# Altium footprint library Sigma_Library.PcbLib: 125 footprints (part 2 of 8)
Each footprint in its own frame and in the unit in brackets; x right, y up, seen from the top. Pads: shape width x height; smd on the part's side, far side on the other; paste and mask are expansions set on the pad; w line width, h text height; cw(c..) or ccw(c..) is an arc to the next point about the centre after c.
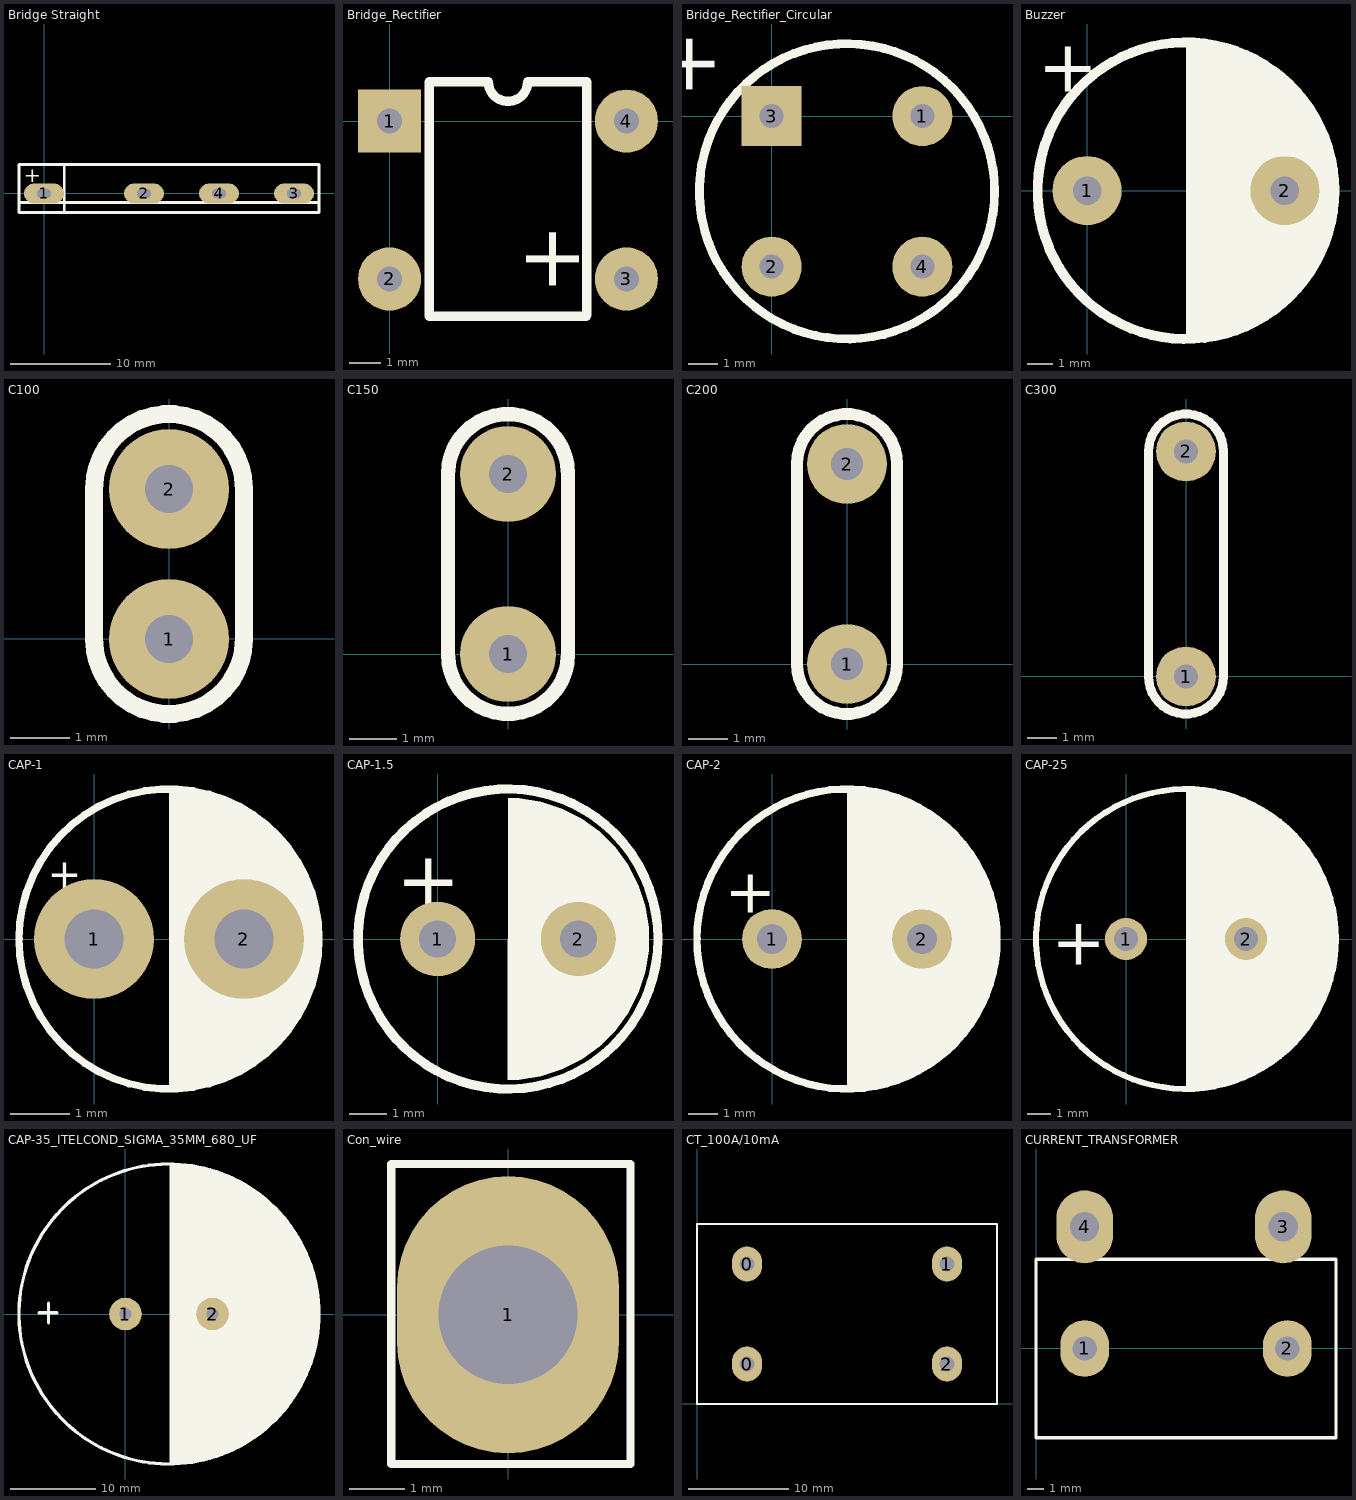
[diagram p1: the footprints below, top view; thin cyan lines are the x and y axes]

## Bridge Straight [mm] "KBJ 2510 / 25A GLASS PASSIVATED BRIDGE RECTIFIER"
height 9.91
pads (4):
  oval 4x2 hole 0.9 slot 1.4 at 0 deg: 1(0,0) 2(10,0) 3(25,0) 4(17.5,0)
Top Overlay:
  lines w0.254: -2.5,-0.9 27.5,-0.9 ; 2.032,-1.9 2.032,2.9 ; -2.5,-1.9 -2.5,2.9 27.5,2.9 27.5,-1.9 -2.5,-1.9
  text "+" at -2.007,1.143 h1.52
3D body "GBJ.STP": height 20, standoff -17.5, extent -2.402,-2.084 27.598,2.616

## Bridge_Rectifier [mil]
pads (4):
  rect 80x80 hole 32: 1(0,0)
  round 80 hole 32: 2(0,-200) 3(300,-200) 4(300,0)
Top Overlay:
  lines w12: 50,-247 100,-247 200,-247 249,-247 250,-246 250,50 175,50 cw(c150,50) 125,50 50,50 50,-247
  text "+" at 240,-220 h78.74
3D body "SDIP4L.stp": height 143.72, standoff 1.38, extent -58.63,-274.06 344.62,60.06

## Bridge_Rectifier_Circular [mil]
pads (4):
  round 80 hole 32: 1(200.79,0) 2(0,-200.79) 4(200.79,-200.79)
  rect 80x80 hole 32: 3(0,0)
Top Overlay:
  circle w11.81: c100.39,-100.39 r196.85
  text "+" at -76,24 h78.74
3D body: height 196.85, standoff 0, extent -94.85,-295.8 298.85,97.8

## Buzzer [mil]
pads (2):
  round 105 hole 43.31: 1(0,0) 2(300,0)
Top Overlay:
  circle w15: c150,0 r225
  region: 150,-225 150,225 164.75,225 193.99,221.15 222.48,213.52 249.73,202.23 275.27,187.48 298.67,169.53 319.53,148.67 337.48,125.27 352.23,99.73 363.52,72.48 371.15,43.99 375,14.75 375,-14.75 371.15,-43.99 363.52,-72.48 352.23,-99.73 337.48,-125.27 319.53,-148.67 298.67,-169.53 275.27,-187.48 249.73,-202.23 222.48,-213.52 193.99,-221.15 164.75,-225
  text "+" at -75,150 h80
3D body "AT-1220-TT-10-R.stp": height 342.52, standoff -118.11, extent -100.15,-236.15 380.16,244.16

## C100 [mil]
pads (2):
  round 80 hole 32: 1(0,0) 2(0,100)
Top Overlay:
  lines w12: -50,0 ccw(c0,0) 50,0 50,100 ccw(c0,100) -50,100 -50,0

## C150 [mil]
pads (2):
  round 80 hole 32: 1(0,0) 2(0,150)
Top Overlay:
  lines w12: -50,0 ccw(c0,0) 50,0 50,150 ccw(c0,150) -50,150 -50,0

## C200 [mil]
pads (2):
  round 80 hole 32: 1(0,0) 2(0,200)
Top Overlay:
  lines w12: -50,0 ccw(c0,0) 50,0 50,200 ccw(c0,200) -50,200 -50,0
3D body "CAP_DISC_4x3_YL.stp": height 176.01, standoff -118.11, extent -65.11,-5.27 53,209.27

## C300 [mil]
pads (2):
  round 80 hole 32: 1(0,0) 2(0,300)
Top Overlay:
  lines w12: -50,299 -50,0 ccw(c0,0) 50,0 50,302 ; -50,300 cw(c0,300) 50,300
3D body "CAP_DISC_4x3_YL-LM.stp": height 196.77, standoff -118.11, extent -61,39.22 57.11,258.78

## CAP-1 [mil]
height 68.9
pads (2):
  round 80 hole 39.37: 1(0,0) 2(100,0)
Top Overlay:
  circle w5: c50,0 r100
  region: 50,-100 50,100 59.85,100 79.17,96.16 97.37,88.62 113.75,77.67 127.67,63.75 138.62,47.37 146.16,29.17 150,9.85 150,-9.85 146.16,-29.17 138.62,-47.37 127.67,-63.75 113.75,-77.67 97.37,-88.62 79.17,-96.16 59.85,-100
  text "+" at -31,34 h19.68
3D body "CAP_RAD_D5x11_POL_BK.stp": height 492.13, standoff -98.43, extent -58.26,-110.24 158.27,106.25

## CAP-1.5 [mil]
pads (2):
  round 80 hole 39.37: 1(0,0) 2(150,0)
Top Overlay:
  circle w10: c75,0 r160
  region: 75,-150 86.81,-150 110.12,-146.31 132.58,-139.01 153.62,-128.29 172.72,-114.41 189.41,-97.72 203.29,-78.62 214.01,-57.58 221.31,-35.12 225,-11.81 225,11.81 221.31,35.12 214.01,57.58 203.29,78.62 189.41,97.72 172.72,114.41 153.62,128.29 132.58,139.01 110.12,146.31 86.81,150 75,150
  text "+" at -44,34 h60
3D body "CAP_RAD_D8x11.5_POL_BK.stp": height 511.81, standoff -98.43, extent -93.32,-167.28 241.32,167.36

## CAP-2 [mil]
pads (2):
  round 80 hole 39.37: 1(0,0) 2(200,0)
Top Overlay:
  circle w10: c100,0 r200
  region: 100,-200 100,200 113.11,200 139.1,196.58 164.43,189.79 188.65,179.76 211.35,166.65 232.15,150.69 250.69,132.15 266.65,111.35 279.76,88.65 289.79,64.43 296.58,39.1 300,13.11 300,-13.11 296.58,-39.1 289.79,-64.43 279.76,-88.65 266.65,-111.35 250.69,-132.15 232.15,-150.69 211.35,-166.65 188.65,-179.76 164.43,-189.79 139.1,-196.58 113.11,-200
  text "+" at -63,35 h60
3D body "CAP_RAD_D10x12.5_POL_BK.stp": height 551.18, standoff -98.43, extent -106.69,-206.64 306.7,206.65

## CAP-25 [mil]
pads (2):
  round 70 hole 39.37: 1(0,0) 2(200,0)
Top Overlay:
  circle w10: c100,0 r250
  region: 100,-250 100,250 114.04,250 141.94,246.86 169.32,240.61 195.82,231.33 221.12,219.15 244.9,204.21 266.85,186.7 286.7,166.85 304.21,144.9 319.15,121.12 331.33,95.82 340.61,69.32 346.86,41.94 350,14.04 350,-14.04 346.86,-41.94 340.61,-69.32 331.33,-95.82 319.15,-121.12 304.21,-144.9 286.7,-166.85 266.85,-186.7 244.9,-204.21 221.12,-219.15 195.82,-231.33 169.32,-240.61 141.94,-246.86 114.04,-250
  text "+" at -124,-43 h78.74
3D body "CAP_RAD_D12.5x15_POL_BK.stp": height 649.61, standoff -98.43, extent -155.91,-250.88 355.9,260.89

## CAP-35_ITELCOND_SIGMA_35MM_680_UF [mil] "680 uF / 450 Vdc"
pads (2):
  round 150 hole 55: 1(0,0) 2(400,0)
Top Overlay:
  circle w15: c200,0 r688.98
  region: 202.36,-688.98 202.36,687.01 226.81,686.81 275.54,682.94 323.88,675.62 371.57,664.89 418.39,650.8 464.09,633.43 508.43,612.85 551.21,589.18 592.2,562.54 631.19,533.05 668,500.87 702.42,466.16 734.3,429.1 763.47,389.86 789.78,348.65 813.09,305.69 833.3,261.17 850.3,215.33 864.01,168.4 874.34,120.62 881.27,72.22 884.74,23.46 884.74,-25.43 881.27,-74.19 874.34,-122.59 864.01,-170.37 850.3,-217.3 833.3,-263.14 813.09,-307.65 789.78,-350.62 763.47,-391.83 734.3,-431.06 702.42,-468.13 668,-502.84 631.19,-535.02 592.2,-564.51 551.21,-591.15 508.43,-614.82 464.09,-635.4 418.39,-652.77 371.57,-666.86 323.88,-677.59 275.54,-684.91 226.81,-688.78
  lines w15: -395.72,6.31 -314.81,6.31 ; -353,-41.52 -353,51
3D body: height 1181.1, standoff 0, extent -490.94,-686.81 887.01,690.76

## Con_wire [mm] "Wire 2 mm (3.14mm2)"
pads (1):
  oval 4x5 hole 2.5: 1(0,0)
Top Overlay:
  lines w0.15: -2.108,-2.692 2.21,-2.692 2.21,2.718 -2.108,2.718 -2.108,-2.692
3D body "DS1021-1x1SF11.stp": height 8.6, standoff -3, extent -1.27,-1.27 1.27,1.27

## CT_100A/10mA [mm] "CT100A / 10mA"
height 31
pads (4):
  oval 3x3.5 hole 1.5: 0(5,4) 0(5,14) 1(25,14) 2(25,4)
Top Overlay:
  lines w0.2: 0,0 0,18 30,18 30,0 0,0
3D body "CT-10-2.stp": height 30.55, standoff -5.55, extent 0,0 30.01,18.1

## CURRENT_TRANSFORMER [mm] "CT6A / 4mA"
pads (4):
  oval 3x3.5 hole 1.5: 1(3,0) 2(15.5,0)
  oval 3.5x4.5 hole 1.8: 3(15.25,7.5) 4(3,7.5)
Top Overlay:
  lines w0.2: 0,-5.5 0,5.5 18.5,5.5 18.5,-5.5 0,-5.5
3D body "AC1015.stp": height 24.3, standoff -4, extent -2.93,-5.763 21.37,5.737